# Altium footprint library IMR_Lib - Copy.PcbLib: 50 footprints (part 4 of 4)
Each footprint in its own frame and in the unit in brackets; x right, y up, seen from the top. Pads: shape width x height; smd on the part's side, far side on the other; paste and mask are expansions set on the pad; w line width, h text height; cw(c..) or ccw(c..) is an arc to the next point about the centre after c.
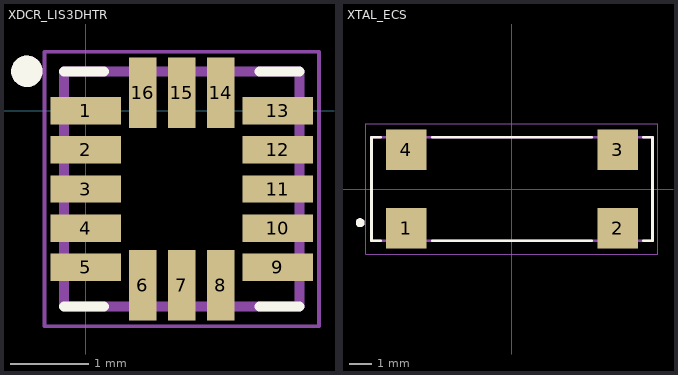
[diagram p3: the footprints below, top view; thin cyan lines are the x and y axes]

## XDCR_LIS3DHTR [mm]
pads (16):
  rect 0.9x0.35 smd paste-1 mask+0: 1(0,0) 2(0,-0.5) 3(0,-1) 4(0,-1.5) 5(0,-2) 9(2.45,-2) 10(2.45,-1.5) 11(2.45,-1) 12(2.45,-0.5) 13(2.45,0)
  rect 0.35x0.9 smd paste-1 mask+0: 6(0.725,-2.225) 7(1.225,-2.225) 8(1.725,-2.225) 14(1.725,0.225) 15(1.225,0.225) 16(0.725,0.225)
Top Overlay:
  circle w0.2: c-0.75,0.5 r0.1
  lines w0.127: -0.275,-2.5 0.235,-2.5 ; -0.275,0.5 0.235,0.5 ; 2.215,-2.5 2.725,-2.5 ; 2.215,0.5 2.725,0.5
Top Paste:
  region: 0.18,-2.14 -0.18,-2.14 -0.18,-1.86 0.18,-1.86
  region: 0.18,-1.64 -0.18,-1.64 -0.18,-1.36 0.18,-1.36
  region: 0.905,-2.365 0.545,-2.365 0.545,-2.085 0.905,-2.085
  region: 0.18,-1.14 -0.18,-1.14 -0.18,-0.86 0.18,-0.86
  region: 0.18,-0.64 -0.18,-0.64 -0.18,-0.36 0.18,-0.36
  region: 0.18,-0.14 -0.18,-0.14 -0.18,0.14 0.18,0.14
  region: 0.905,0.085 0.545,0.085 0.545,0.365 0.905,0.365
  region: 1.405,-2.365 1.045,-2.365 1.045,-2.085 1.405,-2.085
  region: 1.905,-2.365 1.545,-2.365 1.545,-2.085 1.905,-2.085
  region: 2.63,-2.14 2.27,-2.14 2.27,-1.86 2.63,-1.86
  region: 2.63,-1.64 2.27,-1.64 2.27,-1.36 2.63,-1.36
  region: 1.905,0.085 1.545,0.085 1.545,0.365 1.905,0.365
  region: 1.405,0.085 1.045,0.085 1.045,0.365 1.405,0.365
  region: 2.63,-1.14 2.27,-1.14 2.27,-0.86 2.63,-0.86
  region: 2.63,-0.64 2.27,-0.64 2.27,-0.36 2.63,-0.36
  region: 2.63,-0.14 2.27,-0.14 2.27,0.14 2.63,0.14
Top Solder:
  region: 0.275,-2.225 -0.275,-2.225 -0.275,-1.775 0.275,-1.775
  region: 0.275,-1.725 -0.275,-1.725 -0.275,-1.275 0.275,-1.275
  region: 0.275,-1.225 -0.275,-1.225 -0.275,-0.775 0.275,-0.775
  region: 1,-2.45 0.45,-2.45 0.45,-2 1,-2
  region: 0.275,-0.725 -0.275,-0.725 -0.275,-0.275 0.275,-0.275
  region: 0.275,-0.225 -0.275,-0.225 -0.275,0.225 0.275,0.225
  region: 1,0 0.45,0 0.45,0.45 1,0.45
  region: 2,-2.45 1.45,-2.45 1.45,-2 2,-2
  region: 1.5,-2.45 0.95,-2.45 0.95,-2 1.5,-2
  region: 2.725,-2.225 2.175,-2.225 2.175,-1.775 2.725,-1.775
  region: 2.725,-1.725 2.175,-1.725 2.175,-1.275 2.725,-1.275
  region: 1.5,0 0.95,0 0.95,0.45 1.5,0.45
  region: 2,0 1.45,0 1.45,0.45 2,0.45
  region: 2.725,-1.225 2.175,-1.225 2.175,-0.775 2.725,-0.775
  region: 2.725,-0.725 2.175,-0.725 2.175,-0.275 2.725,-0.275
  region: 2.725,-0.225 2.175,-0.225 2.175,0.225 2.725,0.225
Mechanical 13:
  circle w0.2: c-0.75,0.5 r0.1
  lines w0.127: -0.275,-2.5 -0.275,0.5 2.725,0.5 2.725,-2.5 -0.275,-2.5
Mechanical 15:
  lines w0.05: -0.525,-2.75 -0.525,0.75 2.975,0.75 2.975,-2.75 -0.525,-2.75
3D body: height 1, standoff 0, extent -0.275,-2.5 2.725,0.5
3D body: height 1.01, standoff 1, extent 0.038,-0.098 0.436,0.302

## XTAL_ECS [mm] "CRYSTAL ECS SERIES"
height 0.094
pads (4):
  rect 1.8x1.8 smd: 1(-4.7,-1.75) 2(4.7,-1.75) 3(4.7,1.75) 4(-4.7,1.75)
Top Overlay:
  circle w0.2: c-6.75,-1.5 r0.1
  lines w0.127: -5.854,-2.3 -6.25,-2.3 -6.25,2.3 -5.854,2.3 ; -3.546,-2.3 3.546,-2.3 ; -3.546,2.3 3.546,2.3 ; 5.854,-2.3 6.25,-2.3 6.25,2.3 5.854,2.3
Mechanical 13:
  circle w0.2: c-6.75,-1.5 r0.1
  lines w0.127: -6.25,-2.3 6.25,-2.3 6.25,2.3 -6.25,2.3 -6.25,-2.3
Mechanical 15:
  lines w0.05: -6.5,-2.9 6.5,-2.9 6.5,2.9 -6.5,2.9 -6.5,-2.9
3D body "ECS-250-18-7SX-TR.STEP": height 3.7, standoff 0, extent -6.25,-2.3 6.25,2.3